# Altium footprint library NDLib.PCBLIB: 499 footprints (part 11 of 32)
Each footprint in its own frame and in the unit in brackets; x right, y up, seen from the top. Pads: shape width x height; smd on the part's side, far side on the other; paste and mask are expansions set on the pad; w line width, h text height; cw(c..) or ccw(c..) is an arc to the next point about the centre after c.
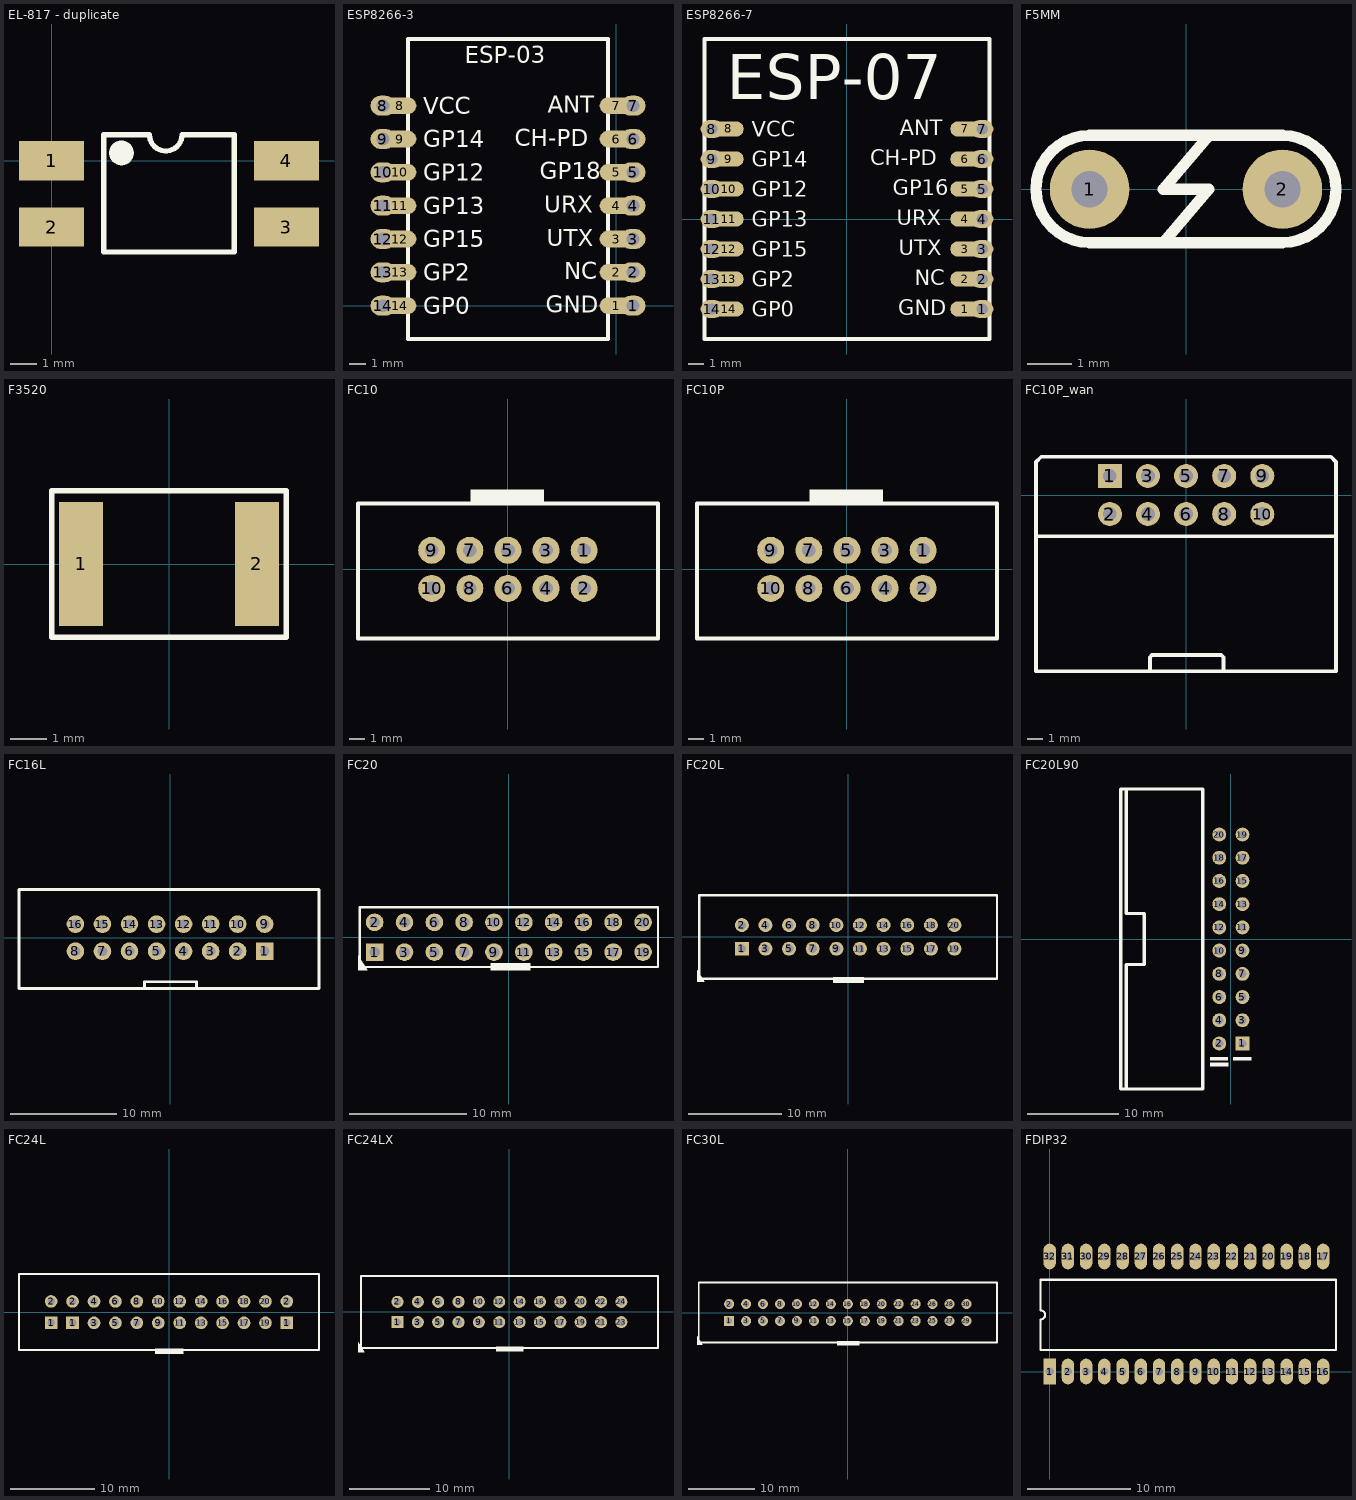
[diagram p10: the footprints below, top view; thin cyan lines are the x and y axes]

## EL-817 - duplicate [mm]
pads (4):
  rect 2.5x1.5 smd: 1(0,0) 2(0,-2.54) 3(9,-2.54) 4(9,0)
TopOverlay:
  circle w0.5: c2.676,0.3 r0.224
  lines w0.2: 3.7,1 2,1 2,-3.5 7,-3.5 7,1 5,1 cw(c4.375,1) 3.75,1
3D body: height 3.75, standoff -0.01, extent -0.52,-3.569 9.64,1.029

## ESP8266-3 [mm]
height 10
pads (28):
  oval 2x1 smd: 1(0,0) 2(0,2) 3(0,4) 4(0,6) 5(0,8) 6(0,10) 7(0,12) 8(-13,12) 9(-13,10) 10(-13,8) 11(-13,6) 12(-13,4) 13(-13,2) 14(-13,0)
  oval 1.5x1.2 hole 0.762: 1(1,0) 2(1,2) 3(1,4) 4(1,6) 5(1,8) 6(1,10) 7(1,12) 8(-14,12) 9(-14,10) 10(-14,8) 11(-14,6) 12(-14,4) 13(-14,2) 14(-14,0)
TopOverlay:
  lines w0.254: -12.5,-2 -12.5,16 -0.5,16 -0.5,-2 -12.5,-2
  text "ESP-03" at -9.102,14.54 h1.02
  text "ANT" at -4.127,11.572 h1.02
  text "CH-PD" at -6.096,9.572 h1.02
  text "GP18" at -4.601,7.572 h1.02
  text "URX" at -4.316,5.572 h1.02
  text "GND" at -4.224,-0.428 h1.02
  text "NC" at -3.126,1.572 h1.02
  text "UTX" at -4.185,3.572 h1.02
  text "GP15" at -11.58,3.492 h1.02
  text "GP2" at -11.58,1.492 h1.02
  text "GP0" at -11.58,-0.508 h1.02
  text "GP13" at -11.58,5.492 h1.02
  text "GP12" at -11.58,7.492 h1.02
  text "GP14" at -11.58,9.492 h1.02
  text "VCC" at -11.58,11.492 h1.02

## ESP8266-7 [mm]
height 4
pads (28):
  oval 2x1 smd: 1(7.881,-6) 2(7.881,-4) 3(7.881,-2) 4(7.881,0) 5(7.881,2) 6(7.881,4) 7(7.881,6) 8(-7.881,6) 9(-7.881,4) 10(-7.881,2) 11(-7.881,0) 12(-7.881,-2) 13(-7.881,-4) 14(-7.881,-6)
  oval 1.5x1.2 hole 0.762: 1(9.008,-6) 2(9.008,-4) 3(9.008,-2) 4(9.008,0) 5(9.008,2) 6(9.008,4) 7(9.008,6) 8(-9.008,6) 9(-9.008,4) 10(-9.008,2) 11(-9.008,0) 12(-9.008,-2) 13(-9.008,-4) 14(-9.008,-6)
TopOverlay:
  lines w0.254: -9.5,-8 -9.5,12 9.5,12 9.5,-8 -9.5,-8
  text "ESP-07" at -8,8 h3
  text "ANT" at 3.516,5.572 h1.02
  text "CH-PD" at 1.547,3.572 h1.02
  text "GP16" at 3.042,1.572 h1.02
  text "URX" at 3.327,-0.428 h1.02
  text "GND" at 3.419,-6.428 h1.02
  text "NC" at 4.517,-4.428 h1.02
  text "UTX" at 3.458,-2.428 h1.02
  text "GP15" at -6.35,-2.508 h1.02
  text "GP2" at -6.35,-4.508 h1.02
  text "GP0" at -6.35,-6.508 h1.02
  text "GP13" at -6.35,-0.508 h1.02
  text "GP12" at -6.35,1.492 h1.02
  text "GP14" at -6.35,3.492 h1.02
  text "VCC" at -6.35,5.492 h1.02

## F5MM [mil]
pads (2):
  round 70 hole 32: 1(-85,0) 2(85,0)
TopOverlay:
  lines w10: -20,-47.06 20,0 -20,0 20,47.06 ; -85,-47.06 cw(c-85,0.19) -85,47.43 85,47.43 cw(c85,0.19) 85,-47.06 -85,-47.06

## F3520 [mm]
height 2
pads (2):
  rect 1.2x3.4 smd: 1(-2.4,0) 2(2.4,0)
TopOverlay:
  lines w0.154: -3.2,-2 -3.2,2 3.2,2 3.2,-2 -3.2,-2

## FC10 [mm]
pads (10):
  round 1.8 hole 0.914: 1(5.08,1.27) 2(5.08,-1.27) 3(2.54,1.27) 4(2.54,-1.27) 5(0,1.27) 6(0,-1.27) 7(-2.54,1.27) 8(-2.54,-1.27) 9(-5.08,1.27) 10(-5.08,-1.27)
TopOverlay:
  region: 2.414,5.32 -2.486,5.32 -2.486,4.39 2.414,4.39
  lines w0.254: -9.996,-4.61 10.004,-4.61 10.004,4.39 -9.996,4.39 -9.996,-4.61
BottomOverlay:
  lines w0.254: -5.086,-2.788 -5.086,-3.888 -4.986,-3.988 2.614,-3.988 2.614,-2.588 ; -2.586,-3.888 -2.586,-2.088 ; 0.014,-3.988 0.014,-2.488
  text "+" at 5.614,-3.088 h1.52
  text "-" at -6.386,-2.888 h1.52
  text "mi" at -4.275,2.692 h2.03
  text "ck" at -1.887,2.711 h2.03
  text "nc" at 3.031,2.711 h2.03
  text "mo" at 6.185,2.711 h2.03
  text "re" at 0.309,2.711 h2.03

## FC10P [mm]
pads (10):
  round 1.8 hole 0.914: 1(5.08,1.27) 2(5.08,-1.27) 3(2.54,1.27) 4(2.54,-1.27) 5(0,1.27) 6(0,-1.27) 7(-2.54,1.27) 8(-2.54,-1.27) 9(-5.08,1.27) 10(-5.08,-1.27)
TopOverlay:
  region: 2.414,5.32 -2.486,5.32 -2.486,4.39 2.414,4.39
  lines w0.254: -9.996,-4.61 -9.996,4.39 10.004,4.39 10.004,-4.61 -9.996,-4.61

## FC10P_wan [mm]
pads (10):
  rect 1.6x1.6 hole 0.914: 1(-5.08,1.27)
  round 1.6 hole 0.914: 2(-5.08,-1.27) 3(-2.54,1.27) 4(-2.54,-1.27) 5(0,1.27) 6(0,-1.27) 7(2.54,1.27) 8(2.54,-1.27) 9(5.08,1.27) 10(5.08,-1.27)
TopOverlay:
  lines w0.254: -2.414,-11.74 -2.414,-10.81 -2.262,-10.658 2.334,-10.658 2.486,-10.81 2.486,-11.692 2.54,-11.746 ; 9.996,1.28 9.996,2.206 9.652,2.55 -9.652,2.55 -10.004,2.198 -10.004,1.944 -10.004,-2.746 ; -10.004,-2.746 9.996,-2.746 ; -10.004,-2.746 -10.004,-11.746 9.996,-11.746 9.996,-2.746 ; 9.996,-2.746 9.996,1.698 9.996,-2.746

## FC16L [mil]
height 500
pads (16):
  rect 65x65 hole 36: 1(350,-50)
  round 65 hole 36: 2(250,-50) 3(150,-50) 4(50,-50) 5(-50,-50) 6(-150,-50) 7(-250,-50) 8(-350,-50) 9(350,50) 10(250,50) 11(150,50) 12(50,50) 13(-50,50) 14(-150,50) 15(-250,50) 16(-350,50)
TopOverlay:
  lines w10: -558.66,-187.79 -94.88,-187.79 ; -558.66,-185.83 -558.66,178.35 550.79,178.35 550.79,-172.05 550.79,-187.79 98.03,-187.79 ; -94.88,-187.8 98.03,-187.79 ; -94.88,-187.79 -94.88,-162.79 98.03,-162.79 98.03,-187.79
BottomOverlay:
  circle w10: c-350,50 r49.44
  region: 250,-100 200,-100 200,-150 250,-150
  region: 300,-100 250,-100 250,-150 300,-150
  region: 375,-100 325,-100 325,-150 375,-150

## FC20 [mm]
pads (20):
  rect 1.5x1.5 hole 0.9: 1(-11.43,-1.27)
  round 1.5 hole 0.9: 2(-11.43,1.27) 3(-8.89,-1.27) 4(-8.89,1.27) 5(-6.35,-1.27) 6(-6.35,1.27) 7(-3.81,-1.27) 8(-3.81,1.27) 9(-1.27,-1.27) 10(-1.27,1.27) 11(1.27,-1.27) 12(1.27,1.27) 13(3.81,-1.27) 14(3.81,1.27) 15(6.35,-1.27) 16(6.35,1.27) 17(8.89,-1.27) 18(8.89,1.27) 19(11.43,-1.27) 20(11.43,1.27)
TopOverlay:
  rectangle: -1.55,-2.85 1.825,-2.2
  region: -12.85,-1.575 -12.85,-2.8 -12.05,-2.8 -12.05,-2.775
  lines w0.2: -12.7,-2.54 -10.795,-2.54 12.7,-2.54 12.7,2.54 -10.795,2.54 -12.7,2.54 -12.7,-2.54

## FC20L [mm]
pads (20):
  rect 1.5x1.5 hole 0.9: 1(-11.43,-1.27)
  round 1.5 hole 0.9: 2(-11.43,1.27) 3(-8.89,-1.27) 4(-8.89,1.27) 5(-6.35,-1.27) 6(-6.35,1.27) 7(-3.81,-1.27) 8(-3.81,1.27) 9(-1.27,-1.27) 10(-1.27,1.27) 11(1.27,-1.27) 12(1.27,1.27) 13(3.81,-1.27) 14(3.81,1.27) 15(6.35,-1.27) 16(6.35,1.27) 17(8.89,-1.27) 18(8.89,1.27) 19(11.43,-1.27) 20(11.43,1.27)
TopOverlay:
  rectangle: -1.651,-4.943 1.724,-4.293
  region: -16.25,-3.576 -16.25,-4.801 -15.45,-4.801 -15.45,-4.776
  lines w0.254: -16,-4.5 16,-4.5 16,4.5 -16,4.5 -16,-4.5

## FC20L90 [mil]
height 393.7
pads (20):
  rect 60x60 hole 36: 1(50,-450)
  round 60 hole 36: 2(-50,-450) 3(50,-350) 4(-50,-350) 5(50,-250) 6(-50,-250) 7(50,-150) 8(-50,-150) 9(50,-50) 10(-50,-50) 11(50,50) 12(-50,50) 13(50,150) 14(-50,150) 15(50,250) 16(-50,250) 17(50,350) 18(-50,350) 19(50,450) 20(-50,450)
TopOverlay:
  rectangle: 9.84,-524.02 88.58,-507.87
  rectangle: -90.16,-524.02 -11.42,-507.87
  rectangle: -89.37,-548.82 -10.63,-532.68
  lines w15: -450,646 -450,109.84 -373.03,109.84 -373.03,-109.84 -450,-109.84 ; -475.2,646 -120.87,646 ; -475.2,646 -120.87,646 ; -475.2,646 -475.2,-646 -120.87,-646 -120.87,646 ; -450,-109.84 -450,-646 -450,-109.84

## FC24L [mm]
pads (24):
  rect 1.5x1.5 hole 0.9: 1(-13.97,-1.27) 1(-11.43,-1.27) 1(13.97,-1.27)
  round 1.5 hole 0.9: 2(-13.97,1.27) 2(-11.43,1.27) 2(13.97,1.27) 3(-8.89,-1.27) 4(-8.89,1.27) 5(-6.35,-1.27) 6(-6.35,1.27) 7(-3.81,-1.27) 8(-3.81,1.27) 9(-1.27,-1.27) 10(-1.27,1.27) 11(1.27,-1.27) 12(1.27,1.27) 13(3.81,-1.27) 14(3.81,1.27) 15(6.35,-1.27) 16(6.35,1.27) 17(8.89,-1.27) 18(8.89,1.27) 19(11.43,-1.27) 20(11.43,1.27)
TopOverlay:
  rectangle: -1.651,-4.943 1.724,-4.293
  lines w0.254: -17.78,-4.5 -17.78,4.5 17.78,4.5 17.78,-4.5 -17.78,-4.5

## FC24LX [mm]
pads (24):
  rect 1.5x1.5 hole 0.9: 1(-13.97,-1.27)
  round 1.5 hole 0.9: 2(-13.97,1.27) 3(-11.43,-1.27) 4(-11.43,1.27) 5(-8.89,-1.27) 6(-8.89,1.27) 7(-6.35,-1.27) 8(-6.35,1.27) 9(-3.81,-1.27) 10(-3.81,1.27) 11(-1.27,-1.27) 12(-1.27,1.27) 13(1.27,-1.27) 14(1.27,1.27) 15(3.81,-1.27) 16(3.81,1.27) 17(6.35,-1.27) 18(6.35,1.27) 19(8.89,-1.27) 20(8.89,1.27) 21(11.43,-1.27) 22(11.43,1.27) 23(13.97,-1.27) 24(13.97,1.27)
TopOverlay:
  rectangle: -1.651,-4.943 1.724,-4.293
  region: -18.899,-3.781 -18.899,-5.006 -18.099,-5.006 -18.099,-4.981
  lines w0.254: -18.54,-4.5 18.54,-4.5 18.54,4.5 -18.54,4.5 -18.54,-4.5

## FC30L [mm]
height 10
pads (30):
  rect 1.5x1.5 hole 0.9: 1(-17.78,-1.27)
  round 1.5 hole 0.9: 2(-17.78,1.27) 3(-15.24,-1.27) 4(-15.24,1.27) 5(-12.7,-1.27) 6(-12.7,1.27) 7(-10.16,-1.27) 8(-10.16,1.27) 9(-7.62,-1.27) 10(-7.62,1.27) 11(-5.08,-1.27) 12(-5.08,1.27) 13(-2.54,-1.27) 14(-2.54,1.27) 15(0,-1.27) 16(0,1.27) 17(2.54,-1.27) 18(2.54,1.27) 19(5.08,-1.27) 20(5.08,1.27) 21(7.62,-1.27) 22(7.62,1.27) 23(10.16,-1.27) 24(10.16,1.27) 25(12.7,-1.27) 26(12.7,1.27) 27(15.24,-1.27) 28(15.24,1.27) 29(17.78,-1.27) 30(17.78,1.27)
TopOverlay:
  rectangle: -1.651,-4.943 1.724,-4.293
  region: -22.6,-3.576 -22.6,-4.801 -21.8,-4.801 -21.8,-4.776
  lines w0.254: -22.35,-4.5 -22.35,4.5 22.35,4.5 22.35,-4.5 -22.35,-4.5

## FDIP32 [mm]
pads (32):
  rect 1.2x2.5 hole 0.8: 1(0,0)
  oval 1.2x2.5 hole 0.8: 2(1.77,0) 3(3.54,0) 4(5.31,0) 5(7.08,0) 6(8.85,0) 7(10.62,0) 8(12.39,0) 9(14.16,0) 10(15.93,0) 11(17.7,0) 12(19.47,0) 13(21.24,0) 14(23.01,0) 15(24.78,0) 16(26.55,0) 17(26.55,11.176) 18(24.78,11.176) 19(23.01,11.176) 20(21.24,11.176) 21(19.47,11.176) 22(17.7,11.176) 23(15.93,11.176) 24(14.16,11.176) 25(12.39,11.176) 26(10.62,11.176) 27(8.85,11.176) 28(7.08,11.176) 29(5.31,11.176) 30(3.54,11.176) 31(1.77,11.176) 32(0,11.176)
TopOverlay:
  lines w0.2: -0.885,2.085 25.665,2.085 27.787,2.085 27.787,8.915 25.665,8.915 -0.885,8.915 -0.885,5.942 cw(c-0.885,5.5) -0.885,5.057 -0.885,2.085